# Altium footprint library DrPCB.PcbLib: 910 footprints (part 53 of 57)
Each footprint in its own frame and in the unit in brackets; x right, y up, seen from the top. Pads: shape width x height; smd on the part's side, far side on the other; paste and mask are expansions set on the pad; w line width, h text height; cw(c..) or ccw(c..) is an arc to the next point about the centre after c.
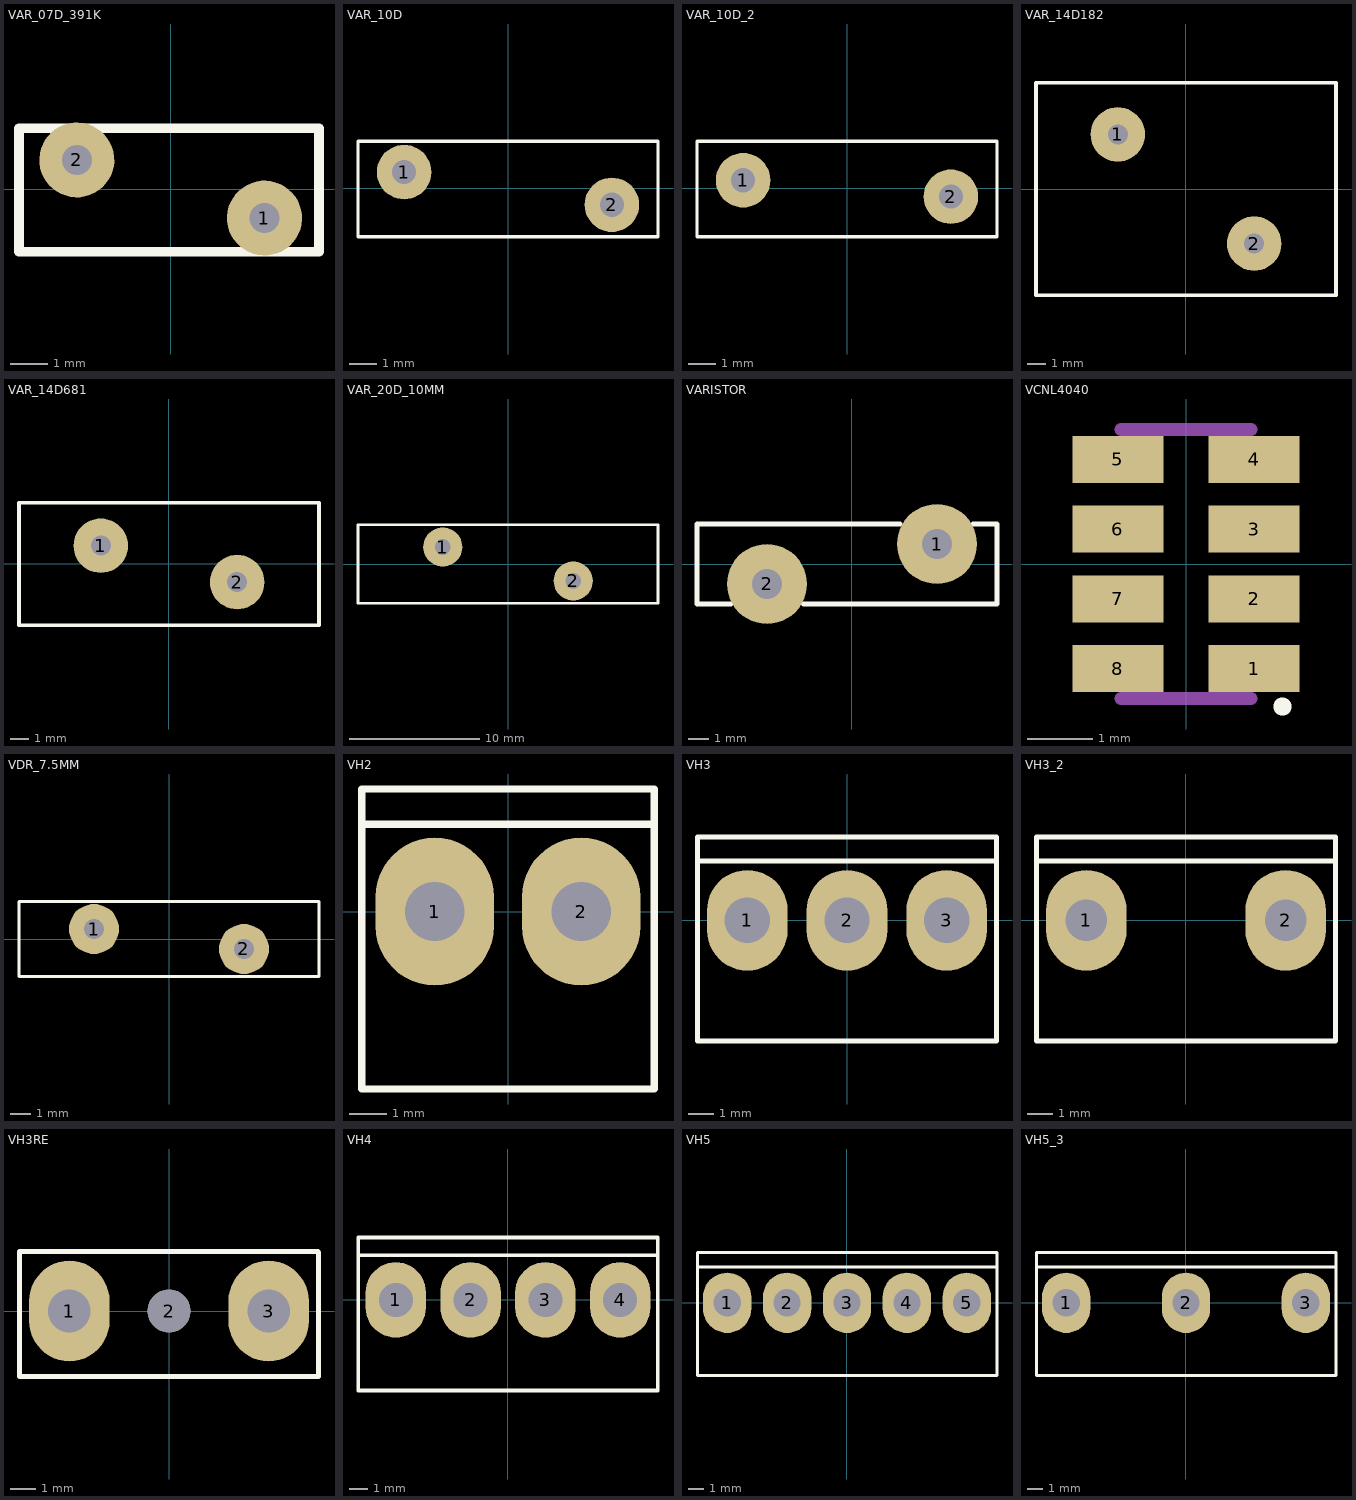
[diagram p52: the footprints below, top view; thin cyan lines are the x and y axes]

## VAR_07D_391K [mm]
pads (2):
  round 2 hole 0.8: 1(2.502,-0.775) 2(-2.502,0.775)
Top Overlay:
  lines w0.254: -4.044,-1.678 -4.044,1.622 3.956,1.622 3.956,-1.678 -4.044,-1.678
3D body "User Library-SIOV-S Varistor (1).step": height 8.5, standoff -29.5, extent -3.544,-1.678 3.455,1.622

## VAR_10D [mm] "VDR, VARISTOR,"
pads (2):
  round 2 hole 0.889: 1(-3.81,0.6) 2(3.81,-0.6)
Top Overlay:
  lines w0.127: -5.498,-1.778 5.497,-1.778 5.497,1.736 -5.498,1.736 -5.498,-1.778
3D body "JVR10N331k_vertical.STEP": height 12, standoff -2.5, extent -5.498,-1.778 5.498,1.736

## VAR_10D_2 [mm] "VDR, VARISTOR,"
pads (2):
  round 2 hole 0.889: 1(-3.81,0.3) 2(3.81,-0.3)
Top Overlay:
  lines w0.127: -5.498,-1.778 -5.498,1.736 5.497,1.736 5.497,-1.778 -5.498,-1.778
3D body "JVR10N331k_vertical.STEP": height 12, standoff -2.5, extent -5.498,-1.778 5.498,1.736

## VAR_14D182 [mm]
pads (2):
  round 3 hole 1.1: 1(-3.75,3) 2(3.75,-3)
Top Overlay:
  lines w0.2: -8.25,-5.85 -8.25,5.85 8.25,5.85 8.25,-5.85 -8.25,-5.85
3D body "mov-14d182k.stp": height 21.75, standoff -20.25, extent -8.25,-5.85 8.25,5.85

## VAR_14D681 [mm]
pads (2):
  round 3 hole 1.1: 1(-3.75,1) 2(3.75,-1)
Top Overlay:
  lines w0.2: -8.25,-3.365 8.25,-3.365 8.25,3.353 -8.25,3.353 -8.25,-3.365
3D body "mov-14d681k.stp": height 21.75, standoff -20.25, extent -8.25,-3.256 8.25,3.244

## VAR_20D_10MM [mm]
pads (2):
  round 3 hole 1.2: 1(-5,1.3) 2(5,-1.3)
Top Overlay:
  lines w0.2: -11.5,-3 -11.5,3 11.5,3 11.5,-3 -11.5,-3
3D body "User Library-Varistor_20mm.STEP": height 24.5, standoff -2.99, extent -10.75,-2.899 10.75,2.899

## VARISTOR [mm]
pads (2):
  round 4 hole 1.5: 1(4.25,1) 2(-4.25,-1)
Top Overlay:
  lines w0.254: -6.064,-2 -7.75,-2 -7.75,2 2.394,2 ; -2.42,-2 7.25,-2 7.25,2 6.052,2

## VCNL4040 [mm]
pads (8):
  rect 1.4x0.725 smd: 1(1.05,-1.612) 2(1.05,-0.537) 3(1.05,0.538) 4(1.05,1.613) 5(-1.05,1.612) 6(-1.05,0.537) 7(-1.05,-0.537) 8(-1.05,-1.612)
Top Overlay:
  circle w0.254: c1.486,-2.197 r0.013
Mechanical 8:
  lines w0.2: -1,-2.07 1,-2.07 ; -1,2.07 1,2.07
3D body "User Library-VCNL4040.STEP": height 1.11, standoff 0.01, extent -1,-2 1,2

## VDR_7.5MM [mm]
pads (2):
  round 2.5 hole 1: 1(-3.75,0.5) 2(3.75,-0.5)
Top Overlay:
  lines w0.15: -7.5,-1.875 7.5,-1.875 7.5,1.875 -7.5,1.875 -7.5,-1.875
3D body "User Library-S14K25 MOV.step": height 18.5, standoff -3, extent -7.75,-2.1 7.75,2.1

## VH2 [mm]
pads (2):
  oval 3.2x4 hole 1.6: 1(-1.98,0) 2(1.98,0)
Top Overlay:
  lines w0.2: -3.96,2.363 3.96,2.363 ; -3.96,-4.8 -3.96,3.315 3.96,3.315 3.96,-4.8 -3.96,-4.8
3D body "User Library-B2P-VH.STEP": height 10.91, standoff -3.69, extent -3.93,-4.65 3.93,3.85

## VH3 [mm]
pads (3):
  oval 3.2x4 hole 1.8: 1(-3.96,0) 2(0,0) 3(3.96,0)
Top Overlay:
  lines w0.2: -5.941,2.363 5.918,2.363 ; 5.918,3.315 -5.941,3.315 -5.941,-4.8 5.941,-4.8 5.941,3.315
3D body "User Library-B3P-VH.STEP": height 10.9, standoff -3.7, extent -5.91,-4.61 5.91,3.89

## VH3_2 [mm]
pads (2):
  oval 3.2x4 hole 1.65: 1(-3.96,0) 2(3.96,0)
Top Overlay:
  lines w0.2: -5.941,2.363 5.918,2.363 ; 5.918,3.315 -5.941,3.315 -5.941,-4.8 5.941,-4.8 5.941,3.315
3D body "User Library-B3P-VH_2.STEP": height 10.9, standoff -3.7, extent -5.923,-4.656 5.898,3.844

## VH3RE [mm]
pads (3):
  oval 3.2x4 hole 1.7: 1(-3.96,0) 3(3.96,0)
  round 1.7 hole 1.7: 2(0,0)
Top Overlay:
  lines w0.2: -5.941,2.324 -5.941,-2.6 5.941,-2.6 5.941,2.324 ; -5.941,2.363 5.918,2.363
3D body "User Library-B3PS-VH.STEP": height 4.75, standoff -7.65, extent -5.91,-14.824 5.91,0.646

## VH4 [mm]
pads (4):
  oval 3.2x4 hole 1.8: 1(-5.941,0) 2(-1.981,0) 3(1.979,0) 4(5.941,0)
Top Overlay:
  lines w0.2: -7.922,2.363 7.899,2.362 ; 7.912,-4.8 -7.922,-4.8 -7.922,3.315 7.912,3.315 ; 7.922,-4.8 7.922,3.315
3D body "User Library-B4P-VH.STEP": height 10.9, standoff -3.7, extent -7.89,-4.635 7.89,3.864

## VH5 [mm]
pads (5):
  oval 3.2x4 hole 1.8: 1(-7.93,0) 2(-3.965,0) 3(0,0) 4(3.965,0) 5(7.93,0)
Top Overlay:
  lines w0.2: -9.911,2.363 9.92,2.362 ; 9.882,-4.8 -9.911,-4.8 -9.911,3.315 9.92,3.315 ; 9.919,-4.8 9.919,3.315
3D body "User Library-B5P-VH.STEP": height 10.9, standoff -3.7, extent -9.87,-4.61 9.87,3.89

## VH5_3 [mm]
pads (3):
  oval 3.2x4 hole 1.8: 1(-7.93,0) 2(0,0) 3(7.93,0)
Top Overlay:
  lines w0.2: -9.911,2.363 9.92,2.362 ; 9.882,-4.8 -9.911,-4.8 -9.911,3.315 9.92,3.315 ; 9.919,-4.8 9.919,3.315
3D body "b5.STEP": height 10.9, standoff -3.7, extent -9.87,-4.623 9.87,3.877